# Altium footprint library 学习.PcbLib: 96 footprints (part 2 of 6)
Each footprint in its own frame and in the unit in brackets; x right, y up, seen from the top. Pads: shape width x height; smd on the part's side, far side on the other; paste and mask are expansions set on the pad; w line width, h text height; cw(c..) or ccw(c..) is an arc to the next point about the centre after c.
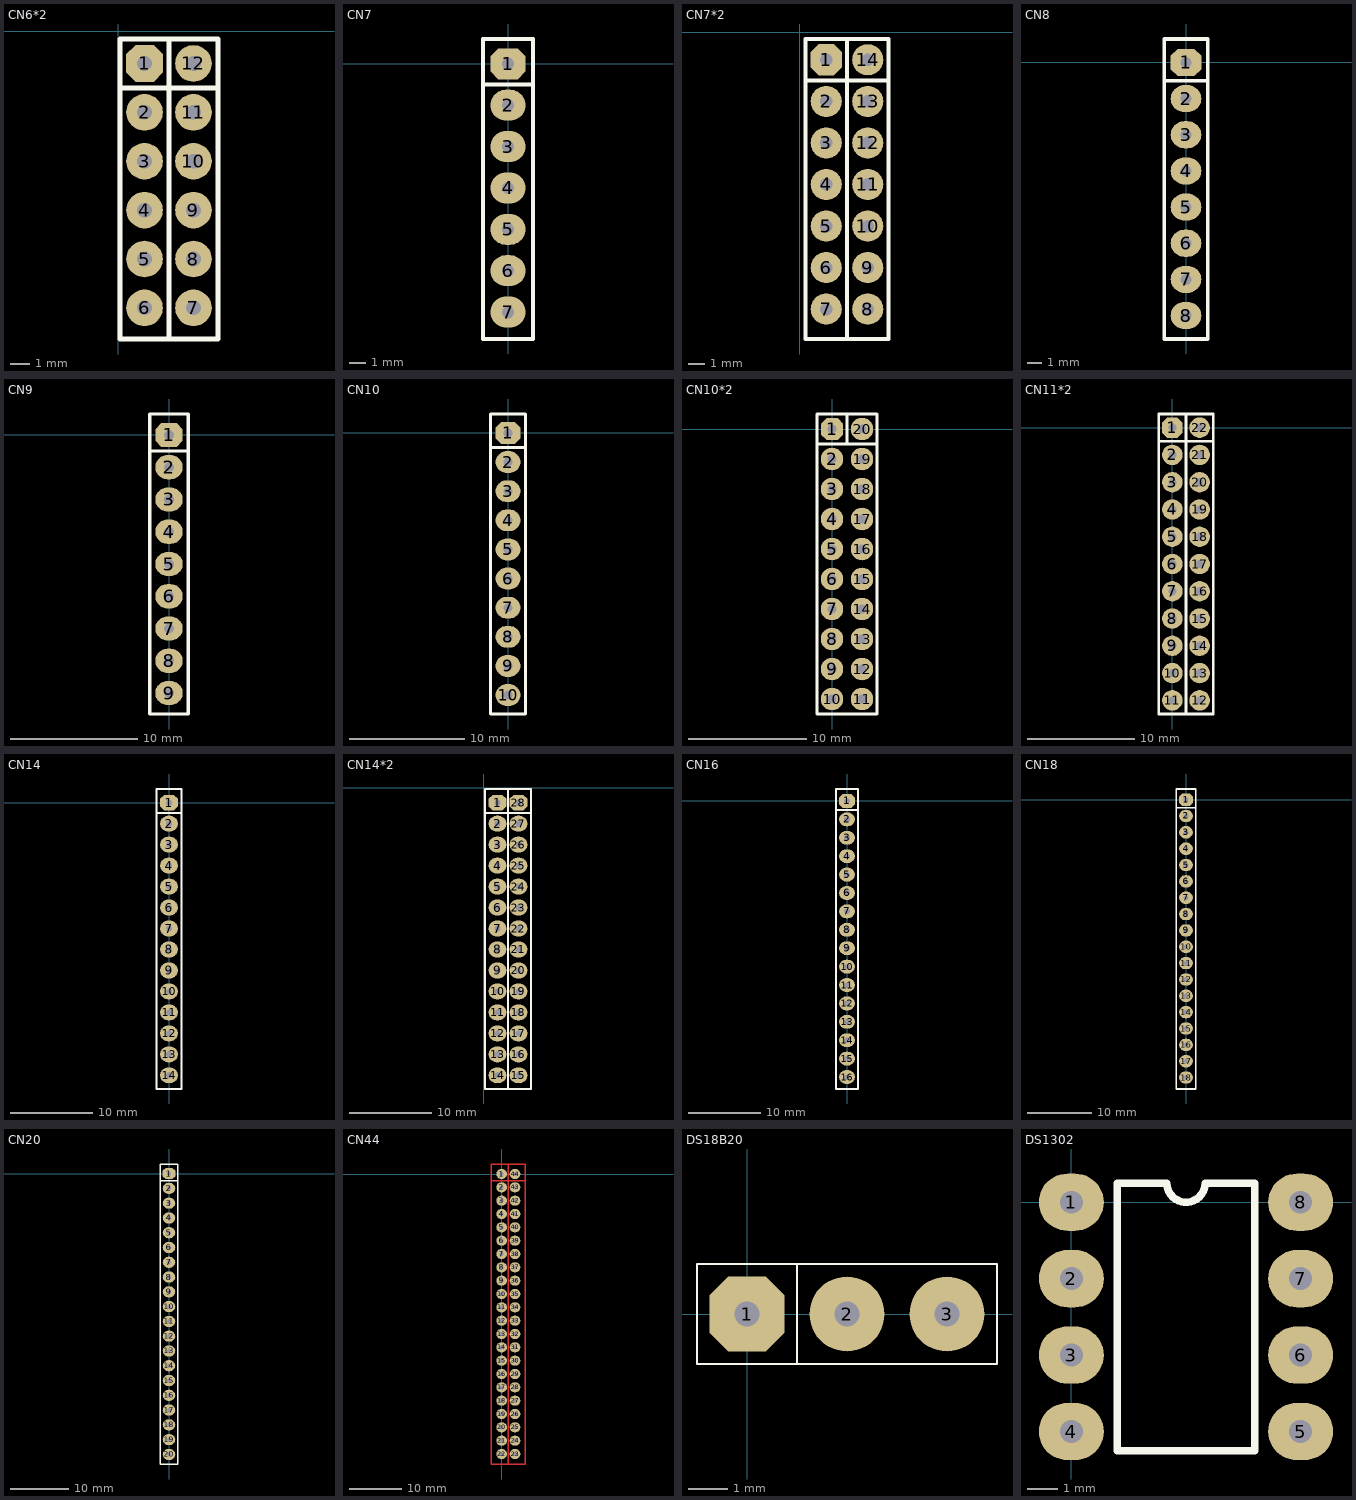
[diagram p1: the footprints below, top view; thin cyan lines are the x and y axes]

## CN6*2 [mil]
pads (12):
  oct 75x75 hole 30: 1(53.45,-66.33)
  round 75 hole 30: 2(53.45,-166.33) 3(53.45,-266.33) 4(53.45,-366.33) 5(53.45,-466.33) 6(53.45,-566.33) 7(153.45,-566.33) 8(153.45,-466.33) 9(153.45,-366.33) 10(153.45,-266.33) 11(153.45,-166.33) 12(153.45,-66.33)
Top Overlay:
  lines w10: 3.45,-116.33 103.45,-116.33 ; 88.45,-116.33 203.45,-116.33 ; 103.45,-629.92 103.45,-116.33 ; 103.45,-16.33 103.45,-116.33 ; 3.45,-629.92 3.45,-16.33 203.45,-16.33 203.45,-629.92 3.45,-629.92

## CN7 [mil]
pads (7):
  oct 85x75 hole 30: 1(0,0)
  oval 85x75 hole 30: 2(0,-100) 3(0,-200) 4(0,-300) 5(0,-400) 6(0,-500) 7(0,-600)
Top Overlay:
  lines w10: -60,-50 60,-50 ; -60,-665 -60,0 ; -60,-665 60,-665 60,10 60,60 -60,60 -60,0 ; -60,-665 -60,0

## CN7*2 [mil]
pads (14):
  oct 75x75 hole 30: 1(63.29,-66.33)
  round 75 hole 30: 2(63.29,-166.33) 3(63.29,-266.33) 4(63.29,-366.33) 5(63.29,-466.33) 6(63.29,-566.33) 7(63.29,-666.33) 8(163.29,-666.33) 9(163.29,-566.33) 10(163.29,-466.33) 11(163.29,-366.33) 12(163.29,-266.33) 13(163.29,-166.33) 14(163.29,-66.33)
Top Overlay:
  lines w10: 13.29,-116.33 113.29,-116.33 ; 98.29,-116.33 213.29,-116.33 ; 113.29,-738.19 113.29,-116.33 ; 113.29,-16.33 113.29,-116.33 ; 13.29,-738.19 213.29,-738.19 213.29,-16.33 13.29,-16.33 13.29,-738.19

## CN8 [mil]
pads (8):
  oct 85x75 hole 30: 1(0,0)
  oval 85x75 hole 30: 2(0,-100) 3(0,-200) 4(0,-300) 5(0,-400) 6(0,-500) 7(0,-600) 8(0,-700)
Top Overlay:
  lines w10: -60,-50 60,-50 ; 60,50 60,65 -60,65 -60,-765 60,-765 60,-10 ; 60,-10 60,60 60,-10

## CN9 [mil]
pads (9):
  oct 85x75 hole 30: 1(0,0)
  oval 85x75 hole 30: 2(0,-100) 3(0,-200) 4(0,-300) 5(0,-400) 6(0,-500) 7(0,-600) 8(0,-700) 9(0,-800)
Top Overlay:
  lines w10: -60,-50 60,-50 ; -60,-865 30,-865 60,-865 60,65 -60,65 -60,-865

## CN10 [mil]
pads (10):
  oct 85x75 hole 30: 1(0,0)
  oval 85x75 hole 30: 2(0,-100) 3(0,-200) 4(0,-300) 5(0,-400) 6(0,-500) 7(0,-600) 8(0,-700) 9(0,-800) 10(0,-900)
Top Overlay:
  lines w10: -60,-50 60,-50 ; -60,-965 -60,65 60,65 60,-865 60,-965 -60,-965

## CN10*2 [mil]
pads (20):
  oct 75x75 hole 30: 1(0,0)
  round 75 hole 30: 2(0,-100) 3(0,-200) 4(0,-300) 5(0,-400) 6(0,-500) 7(0,-600) 8(0,-700) 9(0,-800) 10(0,-900) 11(100,-900) 12(100,-800) 13(100,-700) 14(100,-600) 15(100,-500) 16(100,-400) 17(100,-300) 18(100,-200) 19(100,-100) 20(100,0)
Top Overlay:
  lines w10: -50,-50 50,-50 50,50 ; 35,-50 150,-50 ; -50,-950 150,-950 150,50 -50,50 -50,-950

## CN11*2 [mil]
pads (22):
  oct 75x75 hole 30: 1(0,0)
  round 75 hole 30: 2(0,-100) 3(0,-200) 4(0,-300) 5(0,-400) 6(0,-500) 7(0,-600) 8(0,-700) 9(0,-800) 10(0,-900) 11(0,-1000) 12(100,-1000) 13(100,-900) 14(100,-800) 15(100,-700) 16(100,-600) 17(100,-500) 18(100,-400) 19(100,-300) 20(100,-200) 21(100,-100) 22(100,0)
Top Overlay:
  lines w10: -50,-50 150,-50 ; 50,50 50,-50 50,-1045 55,-1050 ; -50,-1050 150,-1050 150,50 -50,50 -50,-1050

## CN14 [mil]
pads (14):
  oct 85x75 hole 30: 1(0,0)
  oval 85x75 hole 30: 2(0,-100) 3(0,-200) 4(0,-300) 5(0,-400) 6(0,-500) 7(0,-600) 8(0,-700) 9(0,-800) 10(0,-900) 11(0,-1000) 12(0,-1100) 13(0,-1200) 14(0,-1300)
Top Overlay:
  lines w10: -60,-50 60,-50 ; -60,-1365 60,-1365 60,-865 60,65 -60,65 -60,-1365

## CN14*2 [mil]
pads (28):
  oct 85x75 hole 30: 1(65,-70) 28(165,-70)
  oval 85x75 hole 30: 2(65,-170) 3(65,-270) 4(65,-370) 5(65,-470) 6(65,-570) 7(65,-670) 8(65,-770) 9(65,-870) 10(65,-970) 11(65,-1070) 12(65,-1170) 13(65,-1270) 14(65,-1370) 15(165,-1370) 16(165,-1270) 17(165,-1170) 18(165,-1070) 19(165,-970) 20(165,-870) 21(165,-770) 22(165,-670) 23(165,-570) 24(165,-470) 25(165,-370) 26(165,-270) 27(165,-170)
Top Overlay:
  lines w10: 5,-120 125,-120 ; 105,-120 225,-120 ; 125,-1435 5,-1435 5,-5 125,-5 ; 115,-1435 115,-5 225,-5 225,-935 225,-1435 115,-1435

## CN16 [mil]
pads (16):
  oct 85x75 hole 30: 1(0,0)
  oval 85x75 hole 30: 2(0,-100) 3(0,-200) 4(0,-300) 5(0,-400) 6(0,-500) 7(0,-600) 8(0,-700) 9(0,-800) 10(0,-900) 11(0,-1000) 12(0,-1100) 13(0,-1200) 14(0,-1300) 15(0,-1400) 16(0,-1500)
Top Overlay:
  lines w10: -60,-50 60,-50 ; -60,-1565 -60,65 60,65 60,-1565 -60,-1565

## CN18 [mil]
pads (18):
  oct 85x75 hole 30: 1(0,0)
  oval 85x75 hole 30: 2(0,-100) 3(0,-200) 4(0,-300) 5(0,-400) 6(0,-500) 7(0,-600) 8(0,-700) 9(0,-800) 10(0,-900) 11(0,-1000) 12(0,-1100) 13(0,-1200) 14(0,-1300) 15(0,-1400) 16(0,-1500) 17(0,-1600) 18(0,-1700)
Top Overlay:
  lines w10: -60,-50 60,-50 ; -60,-1770 -60,65 60,65 60,-1770 -60,-1770

## CN20 [mil]
pads (20):
  oct 85x75 hole 30: 1(0,0)
  oval 85x75 hole 30: 2(0,-100) 3(0,-200) 4(0,-300) 5(0,-400) 6(0,-500) 7(0,-600) 8(0,-700) 9(0,-800) 10(0,-900) 11(0,-1000) 12(0,-1100) 13(0,-1200) 14(0,-1300) 15(0,-1400) 16(0,-1500) 17(0,-1600) 18(0,-1700) 19(0,-1800) 20(0,-1900)
Top Overlay:
  lines w10: -60,-50 60,-50 ; -60,-1965 -60,65 -45,65 60,65 60,-1965 -60,-1965

## CN44 [mil]
pads (44):
  oval 80x75 hole 30: 1(0,0) 2(0,-100) 3(0,-200) 4(0,-300) 5(0,-400) 6(0,-500) 7(0,-600) 8(0,-700) 9(0,-800) 10(0,-900) 11(0,-1000) 12(0,-1100) 13(0,-1200) 14(0,-1300) 15(0,-1400) 16(0,-1500) 17(0,-1600) 18(0,-1700) 19(0,-1800) 20(0,-1900) 21(0,-2000) 22(0,-2100) 23(100,-2100) 24(100,-2000) 25(100,-1900) 26(100,-1800) 27(100,-1700) 28(100,-1600) 29(100,-1500) 30(100,-1400) 31(100,-1300) 32(100,-1200) 33(100,-1100) 34(100,-1000) 35(100,-900) 36(100,-800) 37(100,-700) 38(100,-600) 39(100,-500) 40(100,-400) 41(100,-300) 42(100,-200) 43(100,-100) 44(100,0)
Top Layer:
  lines w10: -80,-50 175,-50 ; 50,-2175 50,75 ; -80,-2175 175,-2175 175,75 -80,75 -80,-2175

## DS18B20 [mil]
pads (3):
  oct 75x75 hole 25: 1(0,0)
  round 75 hole 25: 2(100,0) 3(200,0)
Top Overlay:
  lines w2: 50,-50 50,50 ; -50,-50 250,-50 250,50 -50,50 -50,-50

## DS1302 [mil]
pads (8):
  oval 85x75 hole 30: 1(0,0) 2(0,-100) 3(0,-200) 4(0,-300) 5(300,-300) 6(300,-200) 7(300,-100) 8(300,0)
Top Overlay:
  lines w10: 60,-325 240,-325 240,25 175,25 cw(c150,25) 125,25 60,25 60,-325